# Altium footprint library PCBLIB.PcbLib: 557 footprints (part 23 of 36)
Each footprint in its own frame and in the unit in brackets; x right, y up, seen from the top. Pads: shape width x height; smd on the part's side, far side on the other; paste and mask are expansions set on the pad; w line width, h text height; cw(c..) or ccw(c..) is an arc to the next point about the centre after c.
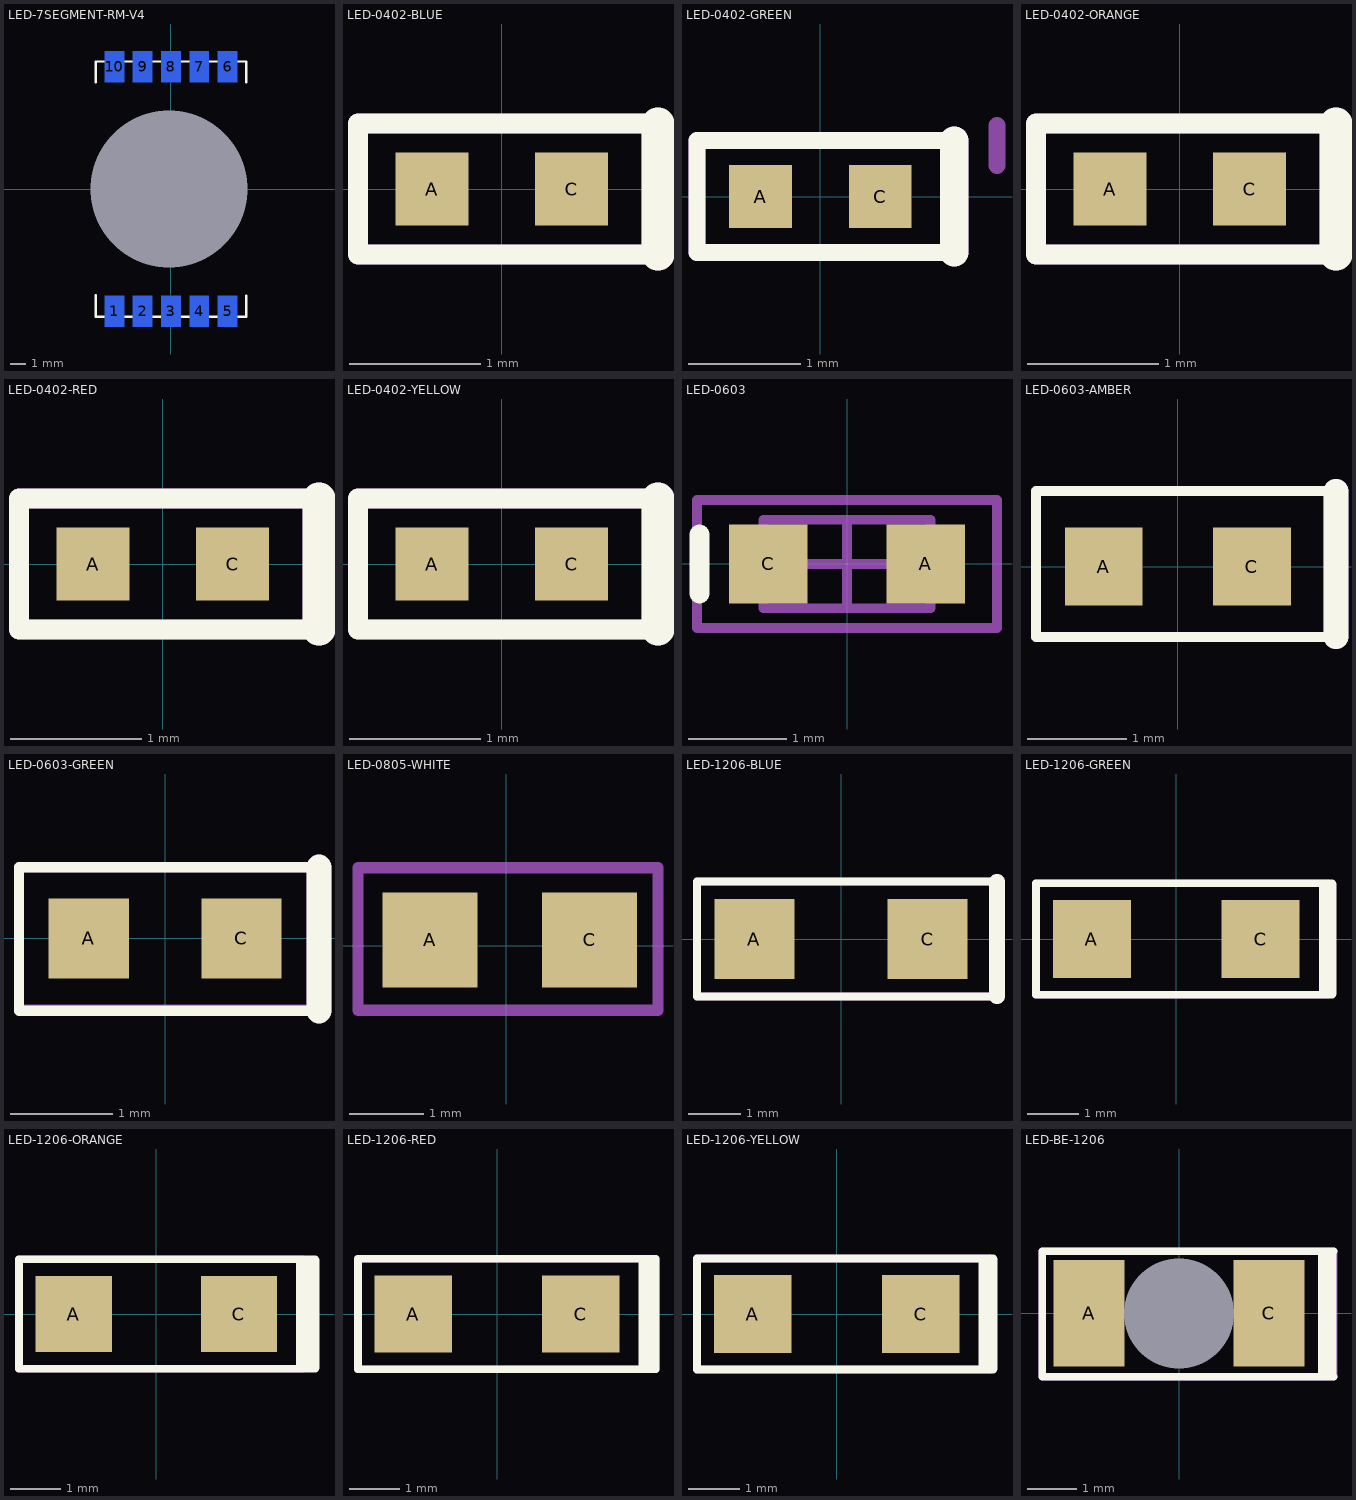
[diagram p22: the footprints below, top view; thin cyan lines are the x and y axes]

## LED-7SEGMENT-RM-V4 [mil]
pads (11):
  rect 50x80 smd far side: 1(-146,-315) 2(-73,-315) 3(0,-315) 4(73,-315) 5(146,-315) 6(146,315) 7(73,315) 8(0,315) 9(-73,315) 10(-146,315)
  round 1 hole 404 square unplated: 4(-5,0)
Top Overlay:
  lines w6: -194,-274 -194,-330 194,-330 194,-275 ; -194,275 -194,329 194,329 194,275
Bottom Overlay:
  lines w6: -194,-338 -194,-387 194,-387 194,-338 ; -194,338 -194,387 194,387 194,338 ; -194,-267 194,-267 194,267 -194,267 -194,-267

## LED-0402-BLUE [mil]
pads (2):
  rect 22x22 smd mask+2: A(-21,0)
  rect 22x22 smd paste+0 mask+2: C(21,0)
Top Overlay:
  lines w6: 47,-19.68 -43.31,-19.68 -43.31,19.68 47,19.68
  lines w9.84: 47,-19.68 47,19.68
ASM Top:
  lines w6: 47,-19.68 -43.31,-19.68 -43.31,19.68 47,19.68
  lines w9.84: 47,-19.68 47,19.68
  text ".designator" at -10,-5.64 h31.5
3D body "led_blue_0402.STEP": height 18.21, standoff 0.5, extent -20.87,-9.84 18.89,9.85

## LED-0402-GREEN [mil]
pads (2):
  rect 22x22 smd mask+2: A(-21,0) C(21,0)
Top Overlay:
  lines w6: 47,-19.68 -43.31,-19.68 -43.31,19.68 47,19.68
  lines w9.84: 47,-19.68 47,19.68
ASM Top:
  lines w6: 47,-19.68 -43.31,-19.68 -43.31,19.68 47,19.68 ; 62,11 62,25
  lines w9.84: 47,-19.68 47,19.68
  text ".designator" at -27,-6 h31.5
3D body "led_green_0402.STEP": height 18.21, standoff 0.5, extent -19.88,-9.84 19.89,9.85

## LED-0402-ORANGE [mil]
pads (2):
  rect 22x22 smd mask+2: A(-21,0) C(21,0)
Top Overlay:
  lines w6: 47,-19.68 -43.31,-19.68 -43.31,19.68 47,19.68
  lines w9.84: 47,-19.68 47,19.68
ASM Top:
  lines w6: 47,-19.68 -43.31,-19.68 -43.31,19.68 47,19.68
  lines w9.84: 47,-19.68 47,19.68
  text ".designator" at -27,-6 h31.5
3D body "led_orange_0402.STEP": height 18.21, standoff 0.5, extent -19.88,-9.84 19.89,9.85

## LED-0402-RED [mil]
pads (2):
  rect 22x22 smd mask+2: A(-21,0) C(21,0)
Top Overlay:
  lines w6: 47,-19.68 -43.31,-19.68 -43.31,19.68 47,19.68
  lines w9.84: 47,-19.68 47,19.68
ASM Top:
  lines w6: 47,-19.68 -43.31,-19.68 -43.31,19.68 47,19.68
  lines w9.84: 47,-19.68 47,19.68
  text ".designator" at -26,-6 h31.5
3D body "led_red_0402.STEP": height 18.21, standoff 0.5, extent -19.88,-9.84 19.89,9.85

## LED-0402-YELLOW [mil]
pads (2):
  rect 22x22 smd mask+2: A(-21,0) C(21,0)
Top Overlay:
  lines w6: 47,-19.68 -43.31,-19.68 -43.31,19.68 47,19.68
  lines w9.84: 47,-19.68 47,19.68
ASM Top:
  lines w6: 47,-19.68 -43.31,-19.68 -43.31,19.68 47,19.68
  lines w9.84: 47,-19.68 47,19.68
  text ".designator" at -27,-6 h31.5
3D body "led_yellow_0402.STEP": height 18.21, standoff 0.5, extent -19.88,-9.84 19.89,9.85

## LED-0603 [mm] "Chip LED, 2-Leads, Body 1.6x0.8mm, IPC Medium Density"
height 0.68
pads (2):
  rect 0.8x0.8 smd: A(0.8,0) C(-0.8,0)
Top Overlay:
  lines w0.2: -1.5,-0.3 -1.5,0.3
Mechanical 15:
  lines w0.1: -0.45,0 0.45,0 ; 0,-0.45 0,0.45 ; -1.525,-0.65 -1.525,0.65 1.525,0.65 1.525,-0.65 -1.525,-0.65
ASM Top:
  lines w0.1: -0.85,-0.45 -0.85,0.45 0.85,0.45 0.85,-0.45 -0.85,-0.45
  text ".designator" at -0.4,-0.4 h0.8
3D body "WL-SMCW_0603_LED.stp": height 0.7, standoff 0, extent -0.8,-0.4 0.8,0.4

## LED-0603-AMBER [mil]
pads (2):
  rect 31x31 smd: A(-29.5,0) C(29.5,0)
Top Overlay:
  lines w4: 62.99,-28 -56.5,-28 -56.5,30 62.99,30
  lines w9.84: 62.99,-28 62.99,30
ASM Top:
  lines w4: 62.99,-28 -56.5,-28 -56.5,30 62.99,30
  lines w9.84: 62.99,-28 62.99,30
  text ".designator" at -14,-6.57 h31.5
3D body "LED_0603_Y.STEP": height 23.62, standoff -0.08, extent -31.49,-15.74 31.5,15.75

## LED-0603-GREEN [mil]
pads (2):
  rect 31x31 smd: A(-29.5,0) C(29.5,0)
Top Overlay:
  lines w4: 59.52,-28 -56.5,-28 -56.5,27.56 59.52,27.56
  lines w9.84: 59.52,-28 59.52,27.56
ASM Top:
  lines w4: 59.52,-27.56 -56.5,-27.56 -56.5,27.56 59.52,27.56
  lines w9.84: 59.52,-28 59.52,27.56
  text ".designator" at -44.5,-15 h31.5
3D body "LED_0603_G.STEP": height 23.62, standoff -0.08, extent -31.99,-15.74 31.01,15.75

## LED-0805-WHITE [mil]
pads (2):
  rect 50x50 smd mask+0: A(-40,3) C(44,3)
ASM Top:
  region: 80,41
  lines w5.91: 80,-34 80,41
  lines w6: 80,-34 -78,-34 -78,41 80,41
  text ".designator" at -59,-17 h31.5
3D body "LED SMD0805.STEP": height 33.72, standoff 0.5, extent -39.6,-13.68 41.6,22

## LED-1206-BLUE [mil]
pads (2):
  rect 60x60 smd: A(-65,0) C(65,0)
Top Overlay:
  lines w6: 117,-43 -108,-43 -108,43 117,43
  lines w11.81: 117,-43 117,43
ASM Top:
  lines w6: 117,-43 -108,-43 -108,43 117,43
  lines w11.81: 117,-43 117,43
  text ".designator" at -58,-8 h31.5
3D body "led_blue_1206.STEP": height 43.8, standoff 0.5, extent -62.38,-31.49 64.39,31.5

## LED-1206-GREEN [mil]
pads (2):
  rect 60x60 smd: A(-65,0) C(65,0)
Top Overlay:
  region: 123,43 110,43 110,-43 123,-43
  lines w6: 120,-43 -108,-43 -108,43 120,43
ASM Top:
  lines w6: -108,-43 -108,43 116,43 116,-7 116,-41 116,-43 -108,-43
  text ".designator" at -90,-24 h31.5
3D body "led_green_1206.STEP": height 43.8, standoff 0.5, extent -62.38,-31.49 64.39,31.5

## LED-1206-ORANGE [mil]
pads (2):
  rect 60x60 smd: A(-65,0) C(65,0)
Top Overlay:
  region: 128,43 110,43 110,-43 128,-43
  lines w6: 125,-43 -108,-43 -108,43 125,43
ASM Top:
  lines w6: -108,-43 -108,43 115,43 115,28 115,-6 115,-43 -108,-43
  text ".designator" at -43,-11 h31.5
3D body "led_orange_1206.STEP": height 43.8, standoff 0.5, extent -62.38,-31.49 64.39,31.5

## LED-1206-RED [mil]
pads (2):
  rect 60x60 smd: A(-65,0) C(65,0)
Top Overlay:
  region: 125,43 110,43 110,-43 125,-43
  lines w6: -108,-43 -108,43 123,43 123,40 123,-34 123,-43 -108,-43
ASM Top:
  lines w6: -108,-43 -108,43 123,43 123,40 123,6 123,-43 -108,-43
  text ".designator" at -41,-19 h31.5
3D body "led_red_1206.STEP": height 43.8, standoff 0.5, extent -62.38,-31.49 64.39,31.5

## LED-1206-YELLOW [mil]
pads (2):
  rect 60x60 smd: A(-65,0) C(65,0)
Top Overlay:
  region: 124,43 110,43 110,-43 124,-43
  lines w6: 121.01,-43 -108,-43 -108,43 121.01,43
ASM Top:
  lines w5.91: 118,-43 118,43
  lines w6: 118,-43 -108,-43 -108,43 118,43
  text ".designator" at -91,-25 h31.5
3D body "led_yellow_1206.STEP": height 43.8, standoff 0.5, extent -62.38,-31.49 64.39,31.5

## LED-BE-1206 [mil]
pads (3):
  round 1 hole 87 unplated: 48(0,0)
  rect 56x84 smd mask+1.97: A(-71,0) C(71,0)
Top Overlay:
  region: 124,49 110,49 110,-50 124,-50
  lines w6: 122.21,-50 -108,-50 -108,49 122.21,49
ASM Top:
  lines w5.91: 122.21,-50 122.21,49
  lines w6: 122.21,-50 -108,-50 -108,49 122.21,49
  text ".designator" at -94,-37 h31.5
3D body "bottom entry.STEP": height 10.38, standoff -31, extent -61,-33 64.98,30